# Altium footprint library DIP Component.PcbLib: 327 footprints (part 11 of 21)
Each footprint in its own frame and in the unit in brackets; x right, y up, seen from the top. Pads: shape width x height; smd on the part's side, far side on the other; paste and mask are expansions set on the pad; w line width, h text height; cw(c..) or ccw(c..) is an arc to the next point about the centre after c.
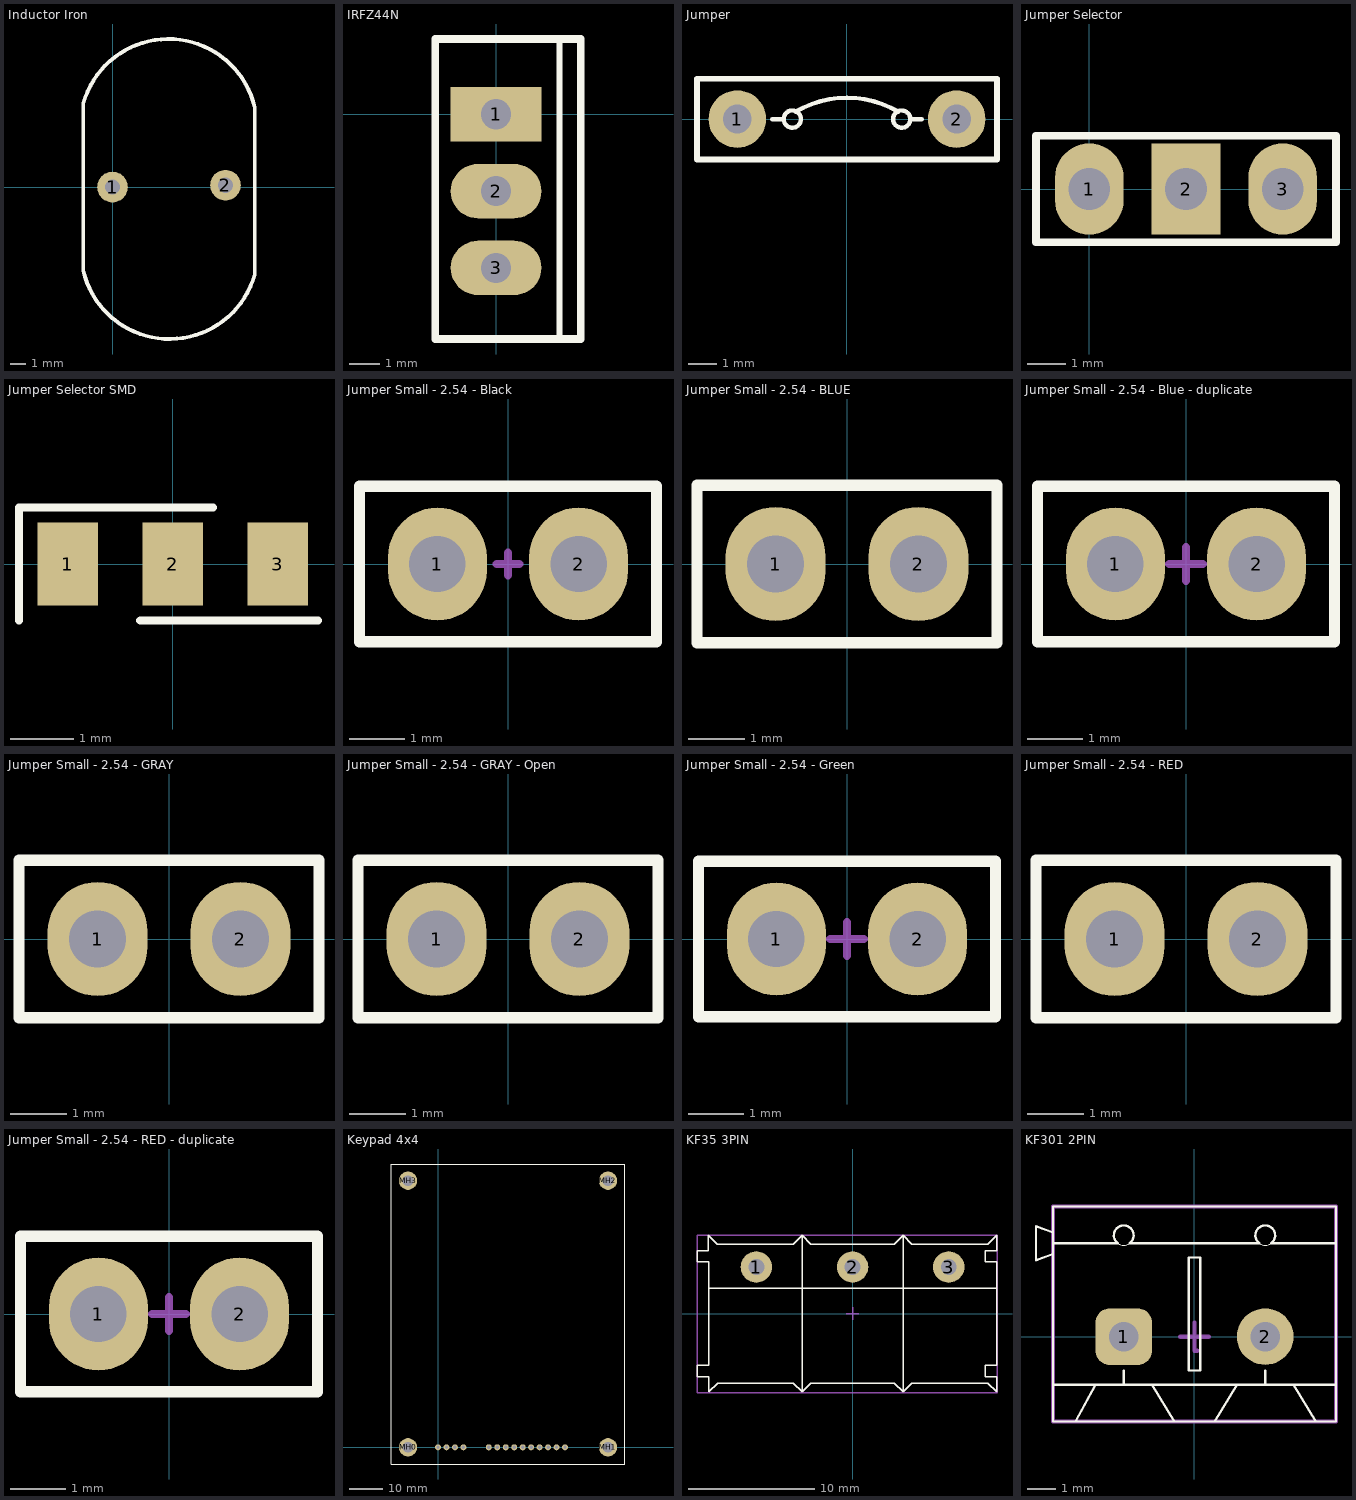
[diagram p10: the footprints below, top view; thin cyan lines are the x and y axes]

## Inductor Iron [mm]
pads (2):
  round 2 hole 1: 1(0,0) 2(7.366,0.127)
Top Overlay:
  lines w0.25: -1.905,-5.461 -1.905,5.461 ; 9.271,-5.715 9.271,5.207
  lines w0.254: -1.905,-5.461 ccw(c3.716,-4.13) 9.271,-5.715 ; -1.905,5.461 cw(c3.65,3.876) 9.271,5.207
3D body "User Library-5701-RC.STEP": height 28.03, standoff -7, extent -1.977,-11.21 9.343,11.21

## IRFZ44N [mm] "IRFZ44N Transistors MOSFET N-Channel TO-220AB"
pads (3):
  rect 3x1.8 hole 1: 1(0,0)
  oval 3x1.8 hole 1: 2(0,-2.54) 3(0,-5.08)
Top Overlay:
  lines w0.2: 2.1,-7.43 2.1,2.49
  lines w0.254: -2.01,-7.43 2.8,-7.43 2.8,2.49 -2.01,2.49 -2.01,-7.43
3D body "User Library-IRFZ44N Transistors MOSFET N-Channel TO-220AB.step": height 20.36, standoff -12.52, extent -1.46,-7.63 2.745,2.53

## Jumper [mm]
pads (2):
  round 2 hole 1: 1(-3.81,0) 2(3.81,0)
Top Overlay:
  circle w0.15: c1.9,0 r0.3
  circle w0.15: c-1.9,0 r0.3
  lines w0.15: -2.6,0 -2.2,0 ; -1.776,0.26 cw(c0,-2.756) 1.776,0.26 ; 2.2,0 2.6,0
  lines w0.2: -5.21,-1.4 -5.21,1.4 5.21,1.4 5.21,-1.4 -5.21,-1.4
3D body "Resistor Zero.STEP": height 2.5, standoff -2.3, extent -4.21,-1.2 4.21,1.2

## Jumper Selector [mm]
pads (3):
  oval 1.8x2.4 hole 1.1: 1(0,0) 3(5.08,0)
  rect 1.8x2.4 hole 1.1: 2(2.54,0)
Top Overlay:
  lines w0.2: -1.4,-1.4 6.48,-1.4 6.48,1.4 -1.4,1.4 -1.4,-1.4
3D body "Header3.STEP": height 8.38, standoff -2.54, extent -1.245,-1.27 6.375,1.27
3D body: height 10.16, standoff 3.05, extent -1.245,-1.27 3.835,1.27

## Jumper Selector SMD [mm]
pads (3):
  rect 0.95x1.3 smd: 1(-1.65,0) 2(0,0) 3(1.65,0)
Top Overlay:
  lines w0.127: -2.413,-0.889 -2.413,0.889 0.635,0.889 ; -0.508,-0.889 2.286,-0.889
3D body "0805.STEP": height 0.6, standoff 0, extent -1.854,-0.635 0.178,0.635

## Jumper Small - 2.54 - Black [mil] "Designer Abbas Basereh"
height 300
pads (2):
  oval 70x80 hole 40: 1(-50,0) 2(50,0)
Top Overlay:
  lines w7.87: -105.12,-55.12 -105.12,55.12 105.12,55.12 105.12,-55.12 -105.12,-55.12
Mechanical 15:
  lines w5.91: -7.87,0 7.87,0 ; 0,-7.87 0,7.87 ; -106.3,-55.12 -106.3,55.12 106.3,55.12 106.3,-55.12 -106.3,-55.12
3D body "header02.STEP": height 330, standoff -100, extent -100,-50 100,50
3D body "jumper_akspt_g-red.STEP": height 337.4, standoff 102.36, extent -98.03,-48.03 98.04,48.04

## Jumper Small - 2.54 - BLUE [mil]
pads (2):
  oval 70x80 hole 40: 1(-50,0) 2(50,0)
Top Overlay:
  lines w7.87: -105.12,-55.12 105.12,-55.12 105.12,55.12 -105.12,55.12 -105.12,-55.12
3D body "jumper_akspt_z-blue.STEP": height 337.4, standoff 102.36, extent -98.03,-48.03 98.03,48.03
3D body "header02.STEP": height 330, standoff -100, extent -100,-50 100,50

## Jumper Small - 2.54 - Blue - duplicate [mil] "Designer Abbas Basereh"
height 300
pads (2):
  oval 70x80 hole 40: 1(-50,0) 2(50,0)
Top Overlay:
  lines w7.87: -105.12,-55.12 105.12,-55.12 105.12,55.12 -105.12,55.12 -105.12,-55.12
Mechanical 15:
  lines w5.91: -11.81,0 11.81,0 ; 0,-11.81 0,11.81 ; -106.3,-55.12 -106.3,55.12 106.3,55.12 106.3,-55.12 -106.3,-55.12
3D body "jumper_akspt_g-red.STEP": height 337.4, standoff 102.36, extent -98.03,-48.03 98.04,48.04
3D body "header02.STEP": height 330, standoff -100, extent -100,-50 100,50

## Jumper Small - 2.54 - GRAY [mil]
pads (2):
  oval 70x80 hole 40: 1(-50,0) 2(50,0)
Top Overlay:
  lines w7.87: -105.12,-55.12 -105.12,55.12 105.12,55.12 105.12,-55.12 -105.12,-55.12
3D body "header02.STEP": height 330, standoff -100, extent -100,-50 100,50
3D body "jumper_akspt_g-grey.STEP": height 337.4, standoff 102.36, extent -98.03,-48.03 98.03,48.03

## Jumper Small - 2.54 - GRAY - Open [mil]
pads (2):
  oval 70x80 hole 40: 1(-50,0) 2(50,0)
Top Overlay:
  lines w7.87: -105.12,-55.12 105.12,-55.12 105.12,55.12 -105.12,55.12 -105.12,-55.12
3D body "jumper_akspt_g-grey.STEP": height 337.4, standoff 102.36, extent 2.75,-48.03 198.82,48.03
3D body "header02.STEP": height 330, standoff -100, extent -100,-50 100,50

## Jumper Small - 2.54 - Green [mil] "Designer Abbas Basereh"
height 300
pads (2):
  oval 70x80 hole 40: 1(-50,0) 2(50,0)
Top Overlay:
  lines w7.87: -105.12,-55.12 105.12,-55.12 105.12,55.12 -105.12,55.12 -105.12,-55.12
Mechanical 15:
  lines w5.91: -11.81,0 11.81,0 ; 0,-11.81 0,11.81 ; -106.3,-55.12 -106.3,55.12 106.3,55.12 106.3,-55.12 -106.3,-55.12
3D body "jumper_akspt_g-red.STEP": height 337.4, standoff 102.36, extent -98.03,-48.03 98.04,48.04
3D body "header02.STEP": height 330, standoff -100, extent -100,-50 100,50

## Jumper Small - 2.54 - RED [mil]
pads (2):
  oval 70x80 hole 40: 1(-50,0) 2(50,0)
Top Overlay:
  lines w7.87: -105.12,-55.12 -105.12,55.12 105.12,55.12 105.12,-55.12 -105.12,-55.12
3D body "header02.STEP": height 330, standoff -100, extent -100,-50 100,50
3D body "jumper_akspt_g-red.STEP": height 337.4, standoff 102.36, extent -98.03,-48.03 98.03,48.03

## Jumper Small - 2.54 - RED - duplicate [mil] "Designer Abbas Basereh"
height 300
pads (2):
  oval 70x80 hole 40: 1(-50,0) 2(50,0)
Top Overlay:
  lines w7.87: -105.12,-55.12 105.12,-55.12 105.12,55.12 -105.12,55.12 -105.12,-55.12
Mechanical 15:
  lines w5.91: -11.81,0 11.81,0 ; 0,-11.81 0,11.81 ; -106.3,-55.12 106.3,-55.12 106.3,55.12 -106.3,55.12 -106.3,-55.12
3D body "jumper_akspt_g-red.STEP": height 337.4, standoff 102.36, extent -98.03,-48.03 98.04,48.04
3D body "header02.STEP": height 330, standoff -100, extent -100,-50 100,50

## Keypad 4x4 [mil] "Matrix Keyboard 4x4"
pads (18):
  round 70 hole 40: 1(0,0) 2(100,0) 3(200,0) 4(300,0) 5(700,0) 6(800,0) 7(900,0) 8(1000,0) 9(600,0) 10(1100,0) 11(1200,0) 12(1300,0) 13(1400,0) 14(1500,0)
  round 216.54 hole 125.98: MH0(-354.33,0) MH1(2007.87,0) MH2(2007.87,3149.61) MH3(-354.33,3149.61)
Top Overlay:
  lines w10: -551.18,-196.85 -551.18,3346.46 2204.72,3346.46 2204.72,-196.85 -551.18,-196.85
3D body "header04-15mm.STEP": height 710, standoff -100, extent -50,-50 350,50
3D body "header10-15mm.STEP": height 710, standoff -100, extent 550,-50 1550,50
3D body "Spacer.STEP": height 590.55, standoff -196.85, extent -466.85,3052.16 -241.82,3247.05
3D body "Spacer.STEP": height 590.55, standoff -196.85, extent -466.84,-97.44 -241.81,97.44
3D body "Spacer.STEP": height 590.55, standoff -196.85, extent 1895.36,-97.44 2120.39,97.44
3D body "Spacer.STEP": height 590.55, standoff -196.85, extent 1895.36,3052.17 2120.39,3247.05
3D body "Keyboard.STEP": height 874.82, standoff 590.55, extent -551.18,-196.85 2204.72,3346.46

## KF35 3PIN [mm] "Designer Abbas Basereh"
height 12.5
pads (3):
  round 2.5 hole 1.25: 1(-7.62,3.7) 2(0,3.7) 3(7.62,3.7)
Top Overlay:
  lines w0.1: -11.4,2 11.4,2 ; -4,-6.2 -4,6.2 ; -4,-6.2 -3.3,-5.5 3.3,-5.5 4,-6.2 ; -4,-6.2 -4.7,-5.5 -10.7,-5.5 -11.4,-6.2 -11.4,-5 -12.3,-5 -12.3,-4.1 -11.4,-4.1 -11.4,4.1 -11.43,4.1 -12.33,4.1 -12.33,5 -11.43,5 -11.43,6.2 -10.73,5.5 -4.7,5.5 -4,6.2 ; -4,6.2 -3.3,5.5 3.3,5.5 4,6.2 ; 4,-6.2 4,6.2 ; 4,-6.2 4.7,-5.5 10.73,-5.5 11.43,-6.2 11.43,-5 10.53,-5 10.53,-4.1 11.43,-4.1 11.43,4.1 10.53,4.1 10.53,5 11.43,5 11.43,6.2 10.73,5.5 4.7,5.5 4,6.2
Mechanical 15:
  lines w0.1: -0.5,0 0.5,0 ; 0,-0.5 0,0.5 ; -12.3,-6.275 -12.3,6.225 11.45,6.225 11.45,-6.275 -12.3,-6.275

## KF301 2PIN [mm] "Designer Abbas Basereh"
height 7.5
pads (2):
  rrect50% 2x2 hole 1.05: 1(-2.5,0)
  round 2 hole 1.05: 2(2.5,0)
Top Overlay:
  lines w0.013: -2.71,3.3 ccw(c-2.5,3.58) -2.29,3.3 ; 2.29,3.3 ccw(c2.5,3.58) 2.71,3.3
  lines w0.08: -4.2,-3 -3.5,-1.7 -1.5,-1.7 -0.7,-3 ; -2.5,-1.7 -2.5,-1.2 ; 0.7,-3 1.5,-1.7 3.5,-1.7 4.3,-3 ; 2.5,-1.7 2.5,-1.2 ; -5.6,2.7 -5.6,3.9 ; -5.6,2.7 -5,2.918 ; -5.6,2.7 -5.6,3.9 ; -5.6,2.7 -5,2.918 ; -5.6,3.9 -5,3.682 ; -5.6,3.9 -5,3.682 ; -5,-3 -5,2.918 ; -5,-3 5,-3 ; -5,-3 5,-3 ; -5,-3 -5,-1.7 ; -5,-1.7 5,-1.7 ; -5,-1.7 -5,3.3 ; -5,3.3 -2.71,3.3 cw(c-2.5,3.58) -2.29,3.3 2.29,3.3 cw(c2.5,3.58) 2.71,3.3 5,3.3 ; -5,3.3 -5,4.6 ; -5,3.682 -5,4.6 ; -5,4.6 5,4.6 ; -5,4.6 5,4.6 ; 5,-3 5,4.6 ; 5,-3 5,-1.7 ; 5,-1.7 5,3.3 ; 5,3.3 5,4.6 ; -0.2,-1.2 0.2,-1.2 0.2,2.8 -0.2,2.8 -0.2,-1.2
Mechanical 15:
  lines w0.15: -0.5,0 0.5,0 ; 0,0.5 0,-0.5 0.1,-0.5 ; -5,-3 -5,4.6 5,4.6 5,-3 -5,-3
3D body "User Library-Terminal-Screw-3A-2way.STEP": height 10, standoff -3, extent -5.6,-3 5,4.6